# Altium schematic symbol library jlcpcb_2025_04_capacitors_extended_1206.schlib: 2503 symbols (part 10 of 14) (continued)
## GCM31CC72A225KE02L
designator C?  Capacitance: 2.2uF  (hidden comment: *)
Capacitor, Ceramic (MLCC), 2.2uF, ±10%, 100V, X7S, ±10%, SMD 1206; Manufacturer: Murata Electronics; Manufacturer Part Number: GCM31CC72A225KE02L; Package Size: 1206; JLCPCB Basic Part: No; JLCPCB Part Number: C363965; Supplier 1: LCSC; Category: Capacitors - MLCC; Supplier Part Number 1: C363965; Tolerance: ±10%; Voltage Rating: 100V; Temperature Coefficient: X7S; RoHS: Yes; ComponentLink1Description: Datasheet; ComponentLink1URL: https://wmsc.lcsc.com/wmsc/upload/file/pdf/v2/lcsc/2304140030_Murata-Electronics-GCM31CC72A225KE02L_C363965.pdf; ComponentLink2Description: JLCPCB Part URL; ComponentLink2URL: https://jlcpcb.com/partdetail/C363965; ComponentLink3Description: LCSC Part URL; ComponentLink3URL: https://lcsc.com/product-detail/Multilayer-Ceramic-Capacitors-MLCC---SMD-SMT_Murata-Electronics-Murata-Electronics-GCM31CC72A225KE02L_C363965.html
footprint CAP-1206 (1206 (3216M) Capacitor)
pins: 1, 2

## GCM31CL8EL225KE07L
designator C?  Capacitance: 2.2uF  (hidden comment: *)
Capacitor, Ceramic (MLCC), 2.2uF, ±10%, 100V, X8L, ±10%, SMD 1206; Manufacturer: Murata Electronics; Manufacturer Part Number: GCM31CL8EL225KE07L; Package Size: 1206; JLCPCB Basic Part: No; JLCPCB Part Number: C710710; Supplier 1: LCSC; Category: Capacitors - MLCC; Supplier Part Number 1: C710710; Tolerance: ±10%; Voltage Rating: 100V; Temperature Coefficient: X8L; RoHS: Yes; ComponentLink1Description: Datasheet; ComponentLink1URL: https://wmsc.lcsc.com/wmsc/upload/file/pdf/v2/lcsc/2308111811_Murata-Electronics-GCM31CL8EL225KE07L_C710710.pdf; ComponentLink2Description: JLCPCB Part URL; ComponentLink2URL: https://jlcpcb.com/partdetail/C710710; ComponentLink3Description: LCSC Part URL; ComponentLink3URL: https://lcsc.com/product-detail/Multilayer-Ceramic-Capacitors-MLCC---SMD-SMT_Murata-Electronics-Murata-Electronics-GCM31CL8EL225KE07L_C710710.html
footprint CAP-1206 (1206 (3216M) Capacitor)
pins: 1, 2

## GCM31CL81H105KA55L
designator C?  Capacitance: 1uF  (hidden comment: *)
Capacitor, Ceramic (MLCC), 1uF, ±10%, 50V, X8L, ±10%, SMD 1206; Manufacturer: Murata Electronics; Manufacturer Part Number: GCM31CL81H105KA55L; Package Size: 1206; JLCPCB Basic Part: No; JLCPCB Part Number: C126596; Supplier 1: LCSC; Category: Capacitors - MLCC; Supplier Part Number 1: C126596; Tolerance: ±10%; Voltage Rating: 50V; Temperature Coefficient: X8L; RoHS: Yes; ComponentLink1Description: Datasheet; ComponentLink1URL: https://wmsc.lcsc.com/wmsc/upload/file/pdf/v2/lcsc/1912111437_Murata-Electronics-GCM31CL81H105KA55L_C126596.pdf; ComponentLink2Description: JLCPCB Part URL; ComponentLink2URL: https://jlcpcb.com/partdetail/C126596; ComponentLink3Description: LCSC Part URL; ComponentLink3URL: https://lcsc.com/product-detail/Multilayer-Ceramic-Capacitors-MLCC---SMD-SMT_Murata-Electronics-Murata-Electronics-GCM31CL81H105KA55L_C126596.html
footprint CAP-1206 (1206 (3216M) Capacitor)
pins: 1, 2

## GCM31CL81H684KA37L
designator C?  Capacitance: 680nF  (hidden comment: *)
Capacitor, Ceramic (MLCC), 680nF, ±10%, 50V, X8L, ±10%, SMD 1206; Manufacturer: Murata Electronics; Manufacturer Part Number: GCM31CL81H684KA37L; Package Size: 1206; JLCPCB Basic Part: No; JLCPCB Part Number: C3887924; Supplier 1: LCSC; Category: Capacitors - MLCC; Supplier Part Number 1: C3887924; Tolerance: ±10%; Voltage Rating: 50V; Temperature Coefficient: X8L; RoHS: Yes; ComponentLink1Description: Datasheet; ComponentLink1URL: https://wmsc.lcsc.com/wmsc/upload/file/pdf/v2/lcsc/2308111433_Murata-Electronics-GCM31CL81H684KA37L_C3887924.pdf; ComponentLink2Description: JLCPCB Part URL; ComponentLink2URL: https://jlcpcb.com/partdetail/C3887924; ComponentLink3Description: LCSC Part URL; ComponentLink3URL: https://lcsc.com/product-detail/Multilayer-Ceramic-Capacitors-MLCC---SMD-SMT_Murata-Electronics-Murata-Electronics-GCM31CL81H684KA37L_C3887924.html
footprint CAP-1206 (1206 (3216M) Capacitor)
pins: 1, 2

## GCM31CM8EG106KE08L
designator C?  Capacitance: 10uF  (hidden comment: *)
Capacitor, Ceramic (MLCC), 10uF, ±10%, 35V, X8M, ±10%, SMD 1206; Manufacturer: Murata Electronics; Manufacturer Part Number: GCM31CM8EG106KE08L; Package Size: 1206; JLCPCB Basic Part: No; JLCPCB Part Number: C3878597; Supplier 1: LCSC; Category: Capacitors - MLCC; Supplier Part Number 1: C3878597; Tolerance: ±10%; Voltage Rating: 35V; Temperature Coefficient: X8M; RoHS: Yes; ComponentLink1Description: Datasheet; ComponentLink1URL: https://wmsc.lcsc.com/wmsc/upload/file/pdf/v2/lcsc/2308111433_Murata-Electronics-GCM31CM8EG106KE08L_C3878597.pdf; ComponentLink2Description: JLCPCB Part URL; ComponentLink2URL: https://jlcpcb.com/partdetail/C3878597; ComponentLink3Description: LCSC Part URL; ComponentLink3URL: https://lcsc.com/product-detail/Multilayer-Ceramic-Capacitors-MLCC---SMD-SMT_Murata-Electronics-Murata-Electronics-GCM31CM8EG106KE08L_C3878597.html
footprint CAP-1206 (1206 (3216M) Capacitor)
pins: 1, 2

## GCM31CR70J226KE23L
designator C?  Capacitance: 22uF  (hidden comment: *)
Capacitor, Ceramic (MLCC), 22uF, ±10%, 6.3V, X7R, ±10%, SMD 1206; Manufacturer: Murata Electronics; Manufacturer Part Number: GCM31CR70J226KE23L; Package Size: 1206; JLCPCB Basic Part: No; JLCPCB Part Number: C417135; Supplier 1: LCSC; Category: Capacitors - MLCC; Supplier Part Number 1: C417135; Tolerance: ±10%; Voltage Rating: 6.3V; Temperature Coefficient: X7R; RoHS: Yes; ComponentLink1Description: Datasheet; ComponentLink1URL: https://wmsc.lcsc.com/wmsc/upload/file/pdf/v2/lcsc/1912111437_Murata-Electronics-GCM31CR70J226KE23L_C417135.pdf; ComponentLink2Description: JLCPCB Part URL; ComponentLink2URL: https://jlcpcb.com/partdetail/C417135; ComponentLink3Description: LCSC Part URL; ComponentLink3URL: https://lcsc.com/product-detail/Multilayer-Ceramic-Capacitors-MLCC---SMD-SMT_Murata-Electronics-Murata-Electronics-GCM31CR70J226KE23L_C417135.html
footprint CAP-1206 (1206 (3216M) Capacitor)
pins: 1, 2

## GCM31CR70J226ME23L
designator C?  Capacitance: 22uF  (hidden comment: *)
Capacitor, Ceramic (MLCC), 22uF, ±20%, 6.3V, X7R, ±20%, SMD 1206; Manufacturer: Murata Electronics; Manufacturer Part Number: GCM31CR70J226ME23L; Package Size: 1206; JLCPCB Basic Part: No; JLCPCB Part Number: C126597; Supplier 1: LCSC; Category: Capacitors - MLCC; Supplier Part Number 1: C126597; Tolerance: ±20%; Voltage Rating: 6.3V; Temperature Coefficient: X7R; RoHS: Yes; ComponentLink1Description: Datasheet; ComponentLink1URL: https://wmsc.lcsc.com/wmsc/upload/file/pdf/v2/lcsc/1912111437_Murata-Electronics-GCM31CR70J226ME23L_C126597.pdf; ComponentLink2Description: JLCPCB Part URL; ComponentLink2URL: https://jlcpcb.com/partdetail/C126597; ComponentLink3Description: LCSC Part URL; ComponentLink3URL: https://lcsc.com/product-detail/Multilayer-Ceramic-Capacitors-MLCC---SMD-SMT_Murata-Electronics-Murata-Electronics-GCM31CR70J226ME23L_C126597.html
footprint CAP-1206 (1206 (3216M) Capacitor)
pins: 1, 2

## GCM31CR71A226KE02L
designator C?  Capacitance: 22uF  (hidden comment: *)
Capacitor, Ceramic (MLCC), 22uF, ±10%, 10V, X7R, ±10%, SMD 1206; Manufacturer: Murata Electronics; Manufacturer Part Number: GCM31CR71A226KE02L; Package Size: 1206; JLCPCB Basic Part: No; JLCPCB Part Number: C126598; Supplier 1: LCSC; Category: Capacitors - MLCC; Supplier Part Number 1: C126598; Tolerance: ±10%; Voltage Rating: 10V; Temperature Coefficient: X7R; RoHS: Yes; ComponentLink1Description: Datasheet; ComponentLink1URL: https://wmsc.lcsc.com/wmsc/upload/file/pdf/v2/lcsc/1810201313_Murata-Electronics-GCM31CR71A226KE02L_C126598.pdf; ComponentLink2Description: JLCPCB Part URL; ComponentLink2URL: https://jlcpcb.com/partdetail/C126598; ComponentLink3Description: LCSC Part URL; ComponentLink3URL: https://lcsc.com/product-detail/Multilayer-Ceramic-Capacitors-MLCC---SMD-SMT_Murata-Electronics-Murata-Electronics-GCM31CR71A226KE02L_C126598.html
footprint CAP-1206 (1206 (3216M) Capacitor)
pins: 1, 2

## GCM31CR71A226ME02L
designator C?  Capacitance: 22uF  (hidden comment: *)
Capacitor, Ceramic (MLCC), 22uF, ±20%, 10V, X7R, ±20%, SMD 1206; Manufacturer: Murata Electronics; Manufacturer Part Number: GCM31CR71A226ME02L; Package Size: 1206; JLCPCB Basic Part: No; JLCPCB Part Number: C710711; Supplier 1: LCSC; Category: Capacitors - MLCC; Supplier Part Number 1: C710711; Tolerance: ±20%; Voltage Rating: 10V; Temperature Coefficient: X7R; RoHS: Yes; ComponentLink1Description: Datasheet; ComponentLink1URL: https://wmsc.lcsc.com/wmsc/upload/file/pdf/v2/lcsc/2109162030_Murata-Electronics-GCM31CR71A226ME02L_C710711.pdf; ComponentLink2Description: JLCPCB Part URL; ComponentLink2URL: https://jlcpcb.com/partdetail/C710711; ComponentLink3Description: LCSC Part URL; ComponentLink3URL: https://lcsc.com/product-detail/Multilayer-Ceramic-Capacitors-MLCC---SMD-SMT_Murata-Electronics-Murata-Electronics-GCM31CR71A226ME02L_C710711.html
footprint CAP-1206 (1206 (3216M) Capacitor)
pins: 1, 2

## GCM31CR71C106KA64L
designator C?  Capacitance: 10uF  (hidden comment: *)
Capacitor, Ceramic (MLCC), 10uF, ±10%, 16V, X7R, ±10%, SMD 1206; Manufacturer: Murata Electronics; Manufacturer Part Number: GCM31CR71C106KA64L; Package Size: 1206; JLCPCB Basic Part: No; JLCPCB Part Number: C126600; Supplier 1: LCSC; Category: Capacitors - MLCC; Supplier Part Number 1: C126600; Tolerance: ±10%; Voltage Rating: 16V; Temperature Coefficient: X7R; RoHS: Yes; ComponentLink1Description: Datasheet; ComponentLink1URL: https://wmsc.lcsc.com/wmsc/upload/file/pdf/v2/lcsc/1809301611_Murata-Electronics-GCM31CR71C106KA64L_C126600.pdf; ComponentLink2Description: JLCPCB Part URL; ComponentLink2URL: https://jlcpcb.com/partdetail/C126600; ComponentLink3Description: LCSC Part URL; ComponentLink3URL: https://lcsc.com/product-detail/Multilayer-Ceramic-Capacitors-MLCC---SMD-SMT_Murata-Electronics-Murata-Electronics-GCM31CR71C106KA64L_C126600.html
footprint CAP-1206 (1206 (3216M) Capacitor)
pins: 1, 2

## GCM31CR71C475KA37L
designator C?  Capacitance: 4.7uF  (hidden comment: *)
Capacitor, Ceramic (MLCC), 4.7uF, ±10%, 16V, X7R, ±10%, SMD 1206; Manufacturer: Murata Electronics; Manufacturer Part Number: GCM31CR71C475KA37L; Package Size: 1206; JLCPCB Basic Part: No; JLCPCB Part Number: C126601; Supplier 1: LCSC; Category: Capacitors - MLCC; Supplier Part Number 1: C126601; Tolerance: ±10%; Voltage Rating: 16V; Temperature Coefficient: X7R; RoHS: Yes; ComponentLink1Description: Datasheet; ComponentLink1URL: https://wmsc.lcsc.com/wmsc/upload/file/pdf/v2/lcsc/1912111437_Murata-Electronics-GCM31CR71C475KA37L_C126601.pdf; ComponentLink2Description: JLCPCB Part URL; ComponentLink2URL: https://jlcpcb.com/partdetail/C126601; ComponentLink3Description: LCSC Part URL; ComponentLink3URL: https://lcsc.com/product-detail/Multilayer-Ceramic-Capacitors-MLCC---SMD-SMT_Murata-Electronics-Murata-Electronics-GCM31CR71C475KA37L_C126601.html
footprint CAP-1206 (1206 (3216M) Capacitor)
pins: 1, 2

## GCM31CR71E475KA55L
designator C?  Capacitance: 4.7uF  (hidden comment: *)
Capacitor, Ceramic (MLCC), 4.7uF, ±10%, 25V, X7R, ±10%, SMD 1206; Manufacturer: Murata Electronics; Manufacturer Part Number: GCM31CR71E475KA55L; Package Size: 1206; JLCPCB Basic Part: No; JLCPCB Part Number: C91602; Supplier 1: LCSC; Category: Capacitors - MLCC; Supplier Part Number 1: C91602; Tolerance: ±10%; Voltage Rating: 25V; Temperature Coefficient: X7R; RoHS: Yes; ComponentLink1Description: Datasheet; ComponentLink1URL: https://wmsc.lcsc.com/wmsc/upload/file/pdf/v2/lcsc/1810201312_Murata-Electronics-GCM31CR71E475KA55L_C91602.pdf; ComponentLink2Description: JLCPCB Part URL; ComponentLink2URL: https://jlcpcb.com/partdetail/C91602; ComponentLink3Description: LCSC Part URL; ComponentLink3URL: https://lcsc.com/product-detail/Multilayer-Ceramic-Capacitors-MLCC---SMD-SMT_Murata-Electronics-Murata-Electronics-GCM31CR71E475KA55L_C91602.html
footprint CAP-1206 (1206 (3216M) Capacitor)
pins: 1, 2

## GCM31CR71H225KA40L
designator C?  Capacitance: 2.2uF  (hidden comment: *)
Capacitor, Ceramic (MLCC), 2.2uF, ±10%, 50V, X7R, ±10%, SMD 1206; Manufacturer: Murata Electronics; Manufacturer Part Number: GCM31CR71H225KA40L; Package Size: 1206; JLCPCB Basic Part: No; JLCPCB Part Number: C521233; Supplier 1: LCSC; Category: Capacitors - MLCC; Supplier Part Number 1: C521233; Tolerance: ±10%; Voltage Rating: 50V; Temperature Coefficient: X7R; RoHS: Yes; ComponentLink1Description: Datasheet; ComponentLink1URL: https://wmsc.lcsc.com/wmsc/upload/file/pdf/v2/lcsc/2304140030_Murata-Electronics-GCM31CR71H225KA40L_C521233.pdf; ComponentLink2Description: JLCPCB Part URL; ComponentLink2URL: https://jlcpcb.com/partdetail/C521233; ComponentLink3Description: LCSC Part URL; ComponentLink3URL: https://lcsc.com/product-detail/Multilayer-Ceramic-Capacitors-MLCC---SMD-SMT_Murata-Electronics-Murata-Electronics-GCM31CR71H225KA40L_C521233.html
footprint CAP-1206 (1206 (3216M) Capacitor)
pins: 1, 2

## GCM31CR71H225KA55K
designator C?  Capacitance: 2.2uF  (hidden comment: *)
Capacitor, Ceramic (MLCC), 2.2uF, ±10%, 50V, X7R, ±10%, SMD 1206; Manufacturer: Murata Electronics; Manufacturer Part Number: GCM31CR71H225KA55K; Package Size: 1206; JLCPCB Basic Part: No; JLCPCB Part Number: C3898561; Supplier 1: LCSC; Category: Capacitors - MLCC; Supplier Part Number 1: C3898561; Tolerance: ±10%; Voltage Rating: 50V; Temperature Coefficient: X7R; RoHS: Yes; ComponentLink1Description: Datasheet; ComponentLink1URL: https://wmsc.lcsc.com/wmsc/upload/file/pdf/v2/lcsc/2308111433_Murata-Electronics-GCM31CR71H225KA55K_C3898561.pdf; ComponentLink2Description: JLCPCB Part URL; ComponentLink2URL: https://jlcpcb.com/partdetail/C3898561; ComponentLink3Description: LCSC Part URL; ComponentLink3URL: https://lcsc.com/product-detail/Multilayer-Ceramic-Capacitors-MLCC---SMD-SMT_Murata-Electronics-Murata-Electronics-GCM31CR71H225KA55K_C3898561.html
footprint CAP-1206 (1206 (3216M) Capacitor)
pins: 1, 2

## GCM31CR71H225KA55L
designator C?  Capacitance: 2.2uF  (hidden comment: *)
Capacitor, Ceramic (MLCC), 2.2uF, ±10%, 50V, X7R, ±10%, SMD 1206; Manufacturer: Murata Electronics; Manufacturer Part Number: GCM31CR71H225KA55L; Package Size: 1206; JLCPCB Basic Part: No; JLCPCB Part Number: C126604; Supplier 1: LCSC; Category: Capacitors - MLCC; Supplier Part Number 1: C126604; Tolerance: ±10%; Voltage Rating: 50V; Temperature Coefficient: X7R; RoHS: Yes; ComponentLink1Description: Datasheet; ComponentLink1URL: https://wmsc.lcsc.com/wmsc/upload/file/pdf/v2/lcsc/1810201230_Murata-Electronics-GCM31CR71H225KA55L_C126604.pdf; ComponentLink2Description: JLCPCB Part URL; ComponentLink2URL: https://jlcpcb.com/partdetail/C126604; ComponentLink3Description: LCSC Part URL; ComponentLink3URL: https://lcsc.com/product-detail/Multilayer-Ceramic-Capacitors-MLCC---SMD-SMT_Murata-Electronics-Murata-Electronics-GCM31CR71H225KA55L_C126604.html
footprint CAP-1206 (1206 (3216M) Capacitor)
pins: 1, 2

## GCM31CR71H684KA37L
designator C?  Capacitance: 680nF  (hidden comment: *)
Capacitor, Ceramic (MLCC), 680nF, ±10%, 50V, X7R, ±10%, SMD 1206; Manufacturer: Murata Electronics; Manufacturer Part Number: GCM31CR71H684KA37L; Package Size: 1206; JLCPCB Basic Part: No; JLCPCB Part Number: C435396; Supplier 1: LCSC; Category: Capacitors - MLCC; Supplier Part Number 1: C435396; Tolerance: ±10%; Voltage Rating: 50V; Temperature Coefficient: X7R; RoHS: Yes; ComponentLink1Description: Datasheet; ComponentLink1URL: https://wmsc.lcsc.com/wmsc/upload/file/pdf/v2/lcsc/2304140030_Murata-Electronics-GCM31CR71H684KA37L_C435396.pdf; ComponentLink2Description: JLCPCB Part URL; ComponentLink2URL: https://jlcpcb.com/partdetail/C435396; ComponentLink3Description: LCSC Part URL; ComponentLink3URL: https://lcsc.com/product-detail/Multilayer-Ceramic-Capacitors-MLCC---SMD-SMT_Murata-Electronics-Murata-Electronics-GCM31CR71H684KA37L_C435396.html
footprint CAP-1206 (1206 (3216M) Capacitor)
pins: 1, 2

## GCM31CR72A105KA03L
designator C?  Capacitance: 1uF  (hidden comment: *)
Capacitor, Ceramic (MLCC), 1uF, ±10%, 100V, X7R, ±10%, SMD 1206; Manufacturer: Murata Electronics; Manufacturer Part Number: GCM31CR72A105KA03L; Package Size: 1206; JLCPCB Basic Part: No; JLCPCB Part Number: C408556; Supplier 1: LCSC; Category: Capacitors - MLCC; Supplier Part Number 1: C408556; Tolerance: ±10%; Voltage Rating: 100V; Temperature Coefficient: X7R; RoHS: Yes; ComponentLink1Description: Datasheet; ComponentLink1URL: https://wmsc.lcsc.com/wmsc/upload/file/pdf/v2/lcsc/1912111437_Murata-Electronics-GCM31CR72A105KA03L_C408556.pdf; ComponentLink2Description: JLCPCB Part URL; ComponentLink2URL: https://jlcpcb.com/partdetail/C408556; ComponentLink3Description: LCSC Part URL; ComponentLink3URL: https://lcsc.com/product-detail/Multilayer-Ceramic-Capacitors-MLCC---SMD-SMT_Murata-Electronics-Murata-Electronics-GCM31CR72A105KA03L_C408556.html
footprint CAP-1206 (1206 (3216M) Capacitor)
pins: 1, 2

## GCM31M5C1H473JA16L
designator C?  Capacitance: 47nF  (hidden comment: *)
Capacitor, Ceramic (MLCC), 47nF, ±5%, null, ±5%, SMD 1206; Manufacturer: Murata Electronics; Manufacturer Part Number: GCM31M5C1H473JA16L; Package Size: 1206; JLCPCB Basic Part: No; JLCPCB Part Number: C913751; Supplier 1: LCSC; Category: Capacitors - MLCC; Supplier Part Number 1: C913751; Tolerance: ±5%; Voltage Rating: null; RoHS: Yes; ComponentLink1Description: Datasheet; ComponentLink1URL: https://wmsc.lcsc.com/wmsc/upload/file/pdf/v2/lcsc/2304140030_Murata-Electronics-GCM31M5C1H473JA16L_C913751.pdf; ComponentLink2Description: JLCPCB Part URL; ComponentLink2URL: https://jlcpcb.com/partdetail/C913751; ComponentLink3Description: LCSC Part URL; ComponentLink3URL: https://lcsc.com/product-detail/Multilayer-Ceramic-Capacitors-MLCC---SMD-SMT_Murata-Electronics-Murata-Electronics-GCM31M5C1H473JA16L_C913751.html
footprint CAP-1206 (1206 (3216M) Capacitor)
pins: 1, 2

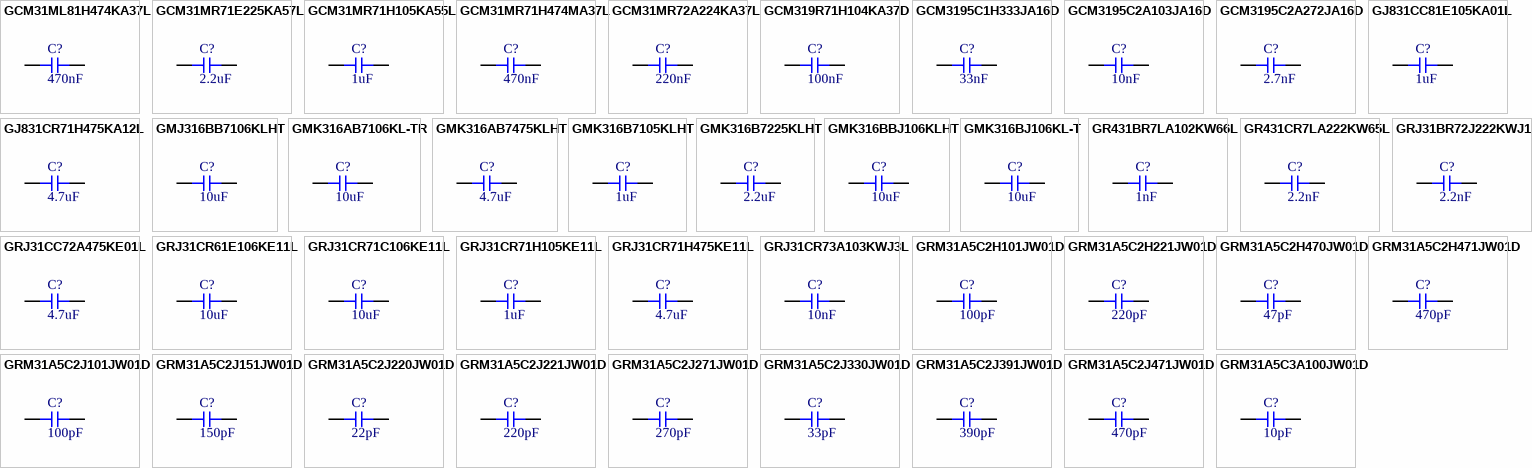
[diagram p45: symbols GCM31ML81H474KA37L to GRM31A5C3A100JW01D]

## GCM31ML81H474KA37L
designator C?  Capacitance: 470nF  (hidden comment: *)
Capacitor, Ceramic (MLCC), 470nF, ±10%, 50V, ±10%, SMD 1206; Manufacturer: Murata Electronics; Manufacturer Part Number: GCM31ML81H474KA37L; Package Size: 1206; JLCPCB Basic Part: No; JLCPCB Part Number: C2280144; Supplier 1: LCSC; Category: Capacitors - MLCC; Supplier Part Number 1: C2280144; Tolerance: ±10%; Voltage Rating: 50V; RoHS: Yes; ComponentLink1Description: Datasheet; ComponentLink1URL: https://wmsc.lcsc.com/wmsc/upload/file/pdf/v2/lcsc/2308111610_Murata-Electronics-GCM31ML81H474KA37L_C2280144.pdf; ComponentLink2Description: JLCPCB Part URL; ComponentLink2URL: https://jlcpcb.com/partdetail/C2280144; ComponentLink3Description: LCSC Part URL; ComponentLink3URL: https://lcsc.com/product-detail/Multilayer-Ceramic-Capacitors-MLCC---SMD-SMT_Murata-Electronics-Murata-Electronics-GCM31ML81H474KA37L_C2280144.html
footprint CAP-1206 (1206 (3216M) Capacitor)
pins: 1, 2

## GCM31MR71E225KA57L
designator C?  Capacitance: 2.2uF  (hidden comment: *)
Capacitor, Ceramic (MLCC), 2.2uF, ±10%, 25V, X7R, ±10%, SMD 1206; Manufacturer: Murata Electronics; Manufacturer Part Number: GCM31MR71E225KA57L; Package Size: 1206; JLCPCB Basic Part: No; JLCPCB Part Number: C126609; Supplier 1: LCSC; Category: Capacitors - MLCC; Supplier Part Number 1: C126609; Tolerance: ±10%; Voltage Rating: 25V; Temperature Coefficient: X7R; RoHS: Yes; ComponentLink1Description: Datasheet; ComponentLink1URL: https://wmsc.lcsc.com/wmsc/upload/file/pdf/v2/lcsc/1811141815_Murata-Electronics-GCM31MR71E225KA57L_C126609.pdf; ComponentLink2Description: JLCPCB Part URL; ComponentLink2URL: https://jlcpcb.com/partdetail/C126609; ComponentLink3Description: LCSC Part URL; ComponentLink3URL: https://lcsc.com/product-detail/Multilayer-Ceramic-Capacitors-MLCC---SMD-SMT_Murata-Electronics-Murata-Electronics-GCM31MR71E225KA57L_C126609.html
footprint CAP-1206 (1206 (3216M) Capacitor)
pins: 1, 2

## GCM31MR71H105KA55L
designator C?  Capacitance: 1uF  (hidden comment: *)
Capacitor, Ceramic (MLCC), 1uF, ±10%, 50V, X7R, ±10%, SMD 1206; Manufacturer: Murata Electronics; Manufacturer Part Number: GCM31MR71H105KA55L; Package Size: 1206; JLCPCB Basic Part: No; JLCPCB Part Number: C85867; Supplier 1: LCSC; Category: Capacitors - MLCC; Supplier Part Number 1: C85867; Tolerance: ±10%; Voltage Rating: 50V; Temperature Coefficient: X7R; RoHS: Yes; ComponentLink1Description: Datasheet; ComponentLink1URL: https://wmsc.lcsc.com/wmsc/upload/file/pdf/v2/lcsc/2304140030_Murata-Electronics-GCM31MR71H105KA55L_C85867.pdf; ComponentLink2Description: JLCPCB Part URL; ComponentLink2URL: https://jlcpcb.com/partdetail/C85867; ComponentLink3Description: LCSC Part URL; ComponentLink3URL: https://lcsc.com/product-detail/Multilayer-Ceramic-Capacitors-MLCC---SMD-SMT_Murata-Electronics-Murata-Electronics-GCM31MR71H105KA55L_C85867.html
footprint CAP-1206 (1206 (3216M) Capacitor)
pins: 1, 2

## GCM31MR71H474MA37L
designator C?  Capacitance: 470nF  (hidden comment: *)
Capacitor, Ceramic (MLCC), 470nF, ±20%, 50V, X7R, ±20%, SMD 1206; Manufacturer: Murata Electronics; Manufacturer Part Number: GCM31MR71H474MA37L; Package Size: 1206; JLCPCB Basic Part: No; JLCPCB Part Number: C161276; Supplier 1: LCSC; Category: Capacitors - MLCC; Supplier Part Number 1: C161276; Tolerance: ±20%; Voltage Rating: 50V; Temperature Coefficient: X7R; RoHS: Yes; ComponentLink1Description: Datasheet; ComponentLink1URL: https://wmsc.lcsc.com/wmsc/upload/file/pdf/v2/lcsc/1810201316_Murata-Electronics-GCM31MR71H474MA37L_C161276.pdf; ComponentLink2Description: JLCPCB Part URL; ComponentLink2URL: https://jlcpcb.com/partdetail/C161276; ComponentLink3Description: LCSC Part URL; ComponentLink3URL: https://lcsc.com/product-detail/Multilayer-Ceramic-Capacitors-MLCC---SMD-SMT_Murata-Electronics-Murata-Electronics-GCM31MR71H474MA37L_C161276.html
footprint CAP-1206 (1206 (3216M) Capacitor)
pins: 1, 2

## GCM31MR72A224KA37L
designator C?  Capacitance: 220nF  (hidden comment: *)
Capacitor, Ceramic (MLCC), 220nF, ±10%, 100V, X7R, ±10%, SMD 1206; Manufacturer: Murata Electronics; Manufacturer Part Number: GCM31MR72A224KA37L; Package Size: 1206; JLCPCB Basic Part: No; JLCPCB Part Number: C161277; Supplier 1: LCSC; Category: Capacitors - MLCC; Supplier Part Number 1: C161277; Tolerance: ±10%; Voltage Rating: 100V; Temperature Coefficient: X7R; RoHS: Yes; ComponentLink1Description: Datasheet; ComponentLink1URL: https://wmsc.lcsc.com/wmsc/upload/file/pdf/v2/lcsc/1810201316_Murata-Electronics-GCM31MR72A224KA37L_C161277.pdf; ComponentLink2Description: JLCPCB Part URL; ComponentLink2URL: https://jlcpcb.com/partdetail/C161277; ComponentLink3Description: LCSC Part URL; ComponentLink3URL: https://lcsc.com/product-detail/Multilayer-Ceramic-Capacitors-MLCC---SMD-SMT_Murata-Electronics-Murata-Electronics-GCM31MR72A224KA37L_C161277.html
footprint CAP-1206 (1206 (3216M) Capacitor)
pins: 1, 2

## GCM319R71H104KA37D
designator C?  Capacitance: 100nF  (hidden comment: *)
Capacitor, Ceramic (MLCC), 100nF, ±10%, 50V, X7R, ±10%, SMD 1206; Manufacturer: Murata Electronics; Manufacturer Part Number: GCM319R71H104KA37D; Package Size: 1206; JLCPCB Basic Part: No; JLCPCB Part Number: C161270; Supplier 1: LCSC; Category: Capacitors - MLCC; Supplier Part Number 1: C161270; Tolerance: ±10%; Voltage Rating: 50V; Temperature Coefficient: X7R; RoHS: Yes; ComponentLink1Description: Datasheet; ComponentLink1URL: https://wmsc.lcsc.com/wmsc/upload/file/pdf/v2/lcsc/2304140030_Murata-Electronics-GCM319R71H104KA37D_C161270.pdf; ComponentLink2Description: JLCPCB Part URL; ComponentLink2URL: https://jlcpcb.com/partdetail/C161270; ComponentLink3Description: LCSC Part URL; ComponentLink3URL: https://lcsc.com/product-detail/Multilayer-Ceramic-Capacitors-MLCC---SMD-SMT_Murata-Electronics-Murata-Electronics-GCM319R71H104KA37D_C161270.html
footprint CAP-1206 (1206 (3216M) Capacitor)
pins: 1, 2

## GCM3195C1H333JA16D
designator C?  Capacitance: 33nF  (hidden comment: *)
Capacitor, Ceramic (MLCC), 33nF, ±5%, 50V, C0G, ±5%, SMD 1206; Manufacturer: Murata Electronics; Manufacturer Part Number: GCM3195C1H333JA16D; Package Size: 1206; JLCPCB Basic Part: No; JLCPCB Part Number: C435395; Supplier 1: LCSC; Category: Capacitors - MLCC; Supplier Part Number 1: C435395; Tolerance: ±5%; Voltage Rating: 50V; Temperature Coefficient: C0G; RoHS: Yes; ComponentLink1Description: Datasheet; ComponentLink1URL: https://wmsc.lcsc.com/wmsc/upload/file/pdf/v2/lcsc/2304140030_Murata-Electronics-GCM3195C1H333JA16D_C435395.pdf; ComponentLink2Description: JLCPCB Part URL; ComponentLink2URL: https://jlcpcb.com/partdetail/C435395; ComponentLink3Description: LCSC Part URL; ComponentLink3URL: https://lcsc.com/product-detail/Multilayer-Ceramic-Capacitors-MLCC---SMD-SMT_Murata-Electronics-Murata-Electronics-GCM3195C1H333JA16D_C435395.html
footprint CAP-1206 (1206 (3216M) Capacitor)
pins: 1, 2

## GCM3195C2A103JA16D
designator C?  Capacitance: 10nF  (hidden comment: *)
Capacitor, Ceramic (MLCC), 10nF, ±5%, 100V, C0G, ±5%, SMD 1206; Manufacturer: Murata Electronics; Manufacturer Part Number: GCM3195C2A103JA16D; Package Size: 1206; JLCPCB Basic Part: No; JLCPCB Part Number: C184799; Supplier 1: LCSC; Category: Capacitors - MLCC; Supplier Part Number 1: C184799; Tolerance: ±5%; Voltage Rating: 100V; Temperature Coefficient: C0G; RoHS: Yes; ComponentLink1Description: Datasheet; ComponentLink1URL: https://wmsc.lcsc.com/wmsc/upload/file/pdf/v2/lcsc/2304140030_Murata-Electronics-GCM3195C2A103JA16D_C184799.pdf; ComponentLink2Description: JLCPCB Part URL; ComponentLink2URL: https://jlcpcb.com/partdetail/C184799; ComponentLink3Description: LCSC Part URL; ComponentLink3URL: https://lcsc.com/product-detail/Multilayer-Ceramic-Capacitors-MLCC---SMD-SMT_Murata-Electronics-Murata-Electronics-GCM3195C2A103JA16D_C184799.html
footprint CAP-1206 (1206 (3216M) Capacitor)
pins: 1, 2

## GCM3195C2A272JA16D
designator C?  Capacitance: 2.7nF  (hidden comment: *)
Capacitor, Ceramic (MLCC), 2.7nF, ±5%, 100V, C0G, ±5%, SMD 1206; Manufacturer: Murata Electronics; Manufacturer Part Number: GCM3195C2A272JA16D; Package Size: 1206; JLCPCB Basic Part: No; JLCPCB Part Number: C437495; Supplier 1: LCSC; Category: Capacitors - MLCC; Supplier Part Number 1: C437495; Tolerance: ±5%; Voltage Rating: 100V; Temperature Coefficient: C0G; RoHS: Yes; ComponentLink1Description: Datasheet; ComponentLink1URL: https://wmsc.lcsc.com/wmsc/upload/file/pdf/v2/lcsc/2304140030_Murata-Electronics-GCM3195C2A272JA16D_C437495.pdf; ComponentLink2Description: JLCPCB Part URL; ComponentLink2URL: https://jlcpcb.com/partdetail/C437495; ComponentLink3Description: LCSC Part URL; ComponentLink3URL: https://lcsc.com/product-detail/Multilayer-Ceramic-Capacitors-MLCC---SMD-SMT_Murata-Electronics-Murata-Electronics-GCM3195C2A272JA16D_C437495.html
footprint CAP-1206 (1206 (3216M) Capacitor)
pins: 1, 2

## GJ831CC81E105KA01L
designator C?  Capacitance: 1uF  (hidden comment: *)
Capacitor, Ceramic (MLCC), 1uF, ±10%, 25V, X6S, ±10%, SMD 1206; Manufacturer: Murata Electronics; Manufacturer Part Number: GJ831CC81E105KA01L; Package Size: 1206; JLCPCB Basic Part: No; JLCPCB Part Number: C397311; Supplier 1: LCSC; Category: Capacitors - MLCC; Supplier Part Number 1: C397311; Tolerance: ±10%; Voltage Rating: 25V; Temperature Coefficient: X6S; RoHS: Yes; ComponentLink1Description: Datasheet; ComponentLink1URL: https://wmsc.lcsc.com/wmsc/upload/file/pdf/v2/lcsc/1912111437_Murata-Electronics-GJ831CC81E105KA01L_C397311.pdf; ComponentLink2Description: JLCPCB Part URL; ComponentLink2URL: https://jlcpcb.com/partdetail/C397311; ComponentLink3Description: LCSC Part URL; ComponentLink3URL: https://lcsc.com/product-detail/Multilayer-Ceramic-Capacitors-MLCC---SMD-SMT_Murata-Electronics-Murata-Electronics-GJ831CC81E105KA01L_C397311.html
footprint CAP-1206 (1206 (3216M) Capacitor)
pins: 1, 2

## GJ831CR71H475KA12L
designator C?  Capacitance: 4.7uF  (hidden comment: *)
Capacitor, Ceramic (MLCC), 4.7uF, ±10%, 50V, X7R, ±10%, SMD 1206; Manufacturer: Murata Electronics; Manufacturer Part Number: GJ831CR71H475KA12L; Package Size: 1206; JLCPCB Basic Part: No; JLCPCB Part Number: C469526; Supplier 1: LCSC; Category: Capacitors - MLCC; Supplier Part Number 1: C469526; Tolerance: ±10%; Voltage Rating: 50V; Temperature Coefficient: X7R; RoHS: Yes; ComponentLink1Description: Datasheet; ComponentLink1URL: https://wmsc.lcsc.com/wmsc/upload/file/pdf/v2/lcsc/2005281231_Murata-Electronics-GJ831CR71H475KA12L_C469526.pdf; ComponentLink2Description: JLCPCB Part URL; ComponentLink2URL: https://jlcpcb.com/partdetail/C469526; ComponentLink3Description: LCSC Part URL; ComponentLink3URL: https://lcsc.com/product-detail/Multilayer-Ceramic-Capacitors-MLCC---SMD-SMT_Murata-Electronics-Murata-Electronics-GJ831CR71H475KA12L_C469526.html
footprint CAP-1206 (1206 (3216M) Capacitor)
pins: 1, 2

## GMJ316BB7106KLHT
designator C?  Capacitance: 10uF  (hidden comment: *)
Capacitor, Ceramic (MLCC), 10uF, ±10%, 35V, X7R, ±10%, SMD 1206; Manufacturer: Taiyo Yuden; Manufacturer Part Number: GMJ316BB7106KLHT; Package Size: 1206; JLCPCB Basic Part: No; JLCPCB Part Number: C412612; Supplier 1: LCSC; Category: Capacitors - MLCC; Supplier Part Number 1: C412612; Tolerance: ±10%; Voltage Rating: 35V; Temperature Coefficient: X7R; RoHS: Yes; ComponentLink1Description: Datasheet; ComponentLink1URL: https://wmsc.lcsc.com/wmsc/upload/file/pdf/v2/lcsc/2304140030_Taiyo-Yuden-GMJ316BB7106KLHT_C412612.pdf; ComponentLink2Description: JLCPCB Part URL; ComponentLink2URL: https://jlcpcb.com/partdetail/C412612; ComponentLink3Description: LCSC Part URL; ComponentLink3URL: https://lcsc.com/product-detail/Multilayer-Ceramic-Capacitors-MLCC---SMD-SMT_Taiyo-Yuden-Taiyo-Yuden-GMJ316BB7106KLHT_C412612.html
footprint CAP-1206 (1206 (3216M) Capacitor)
pins: 1, 2

## GMK316AB7106KL-TR
designator C?  Capacitance: 10uF  (hidden comment: *)
Capacitor, Ceramic (MLCC), 10uF, ±10%, 35V, X7R, ±10%, SMD 1206; Manufacturer: Taiyo Yuden; Manufacturer Part Number: GMK316AB7106KL-TR; Package Size: 1206; JLCPCB Basic Part: No; JLCPCB Part Number: C454102; Supplier 1: LCSC; Category: Capacitors - MLCC; Supplier Part Number 1: C454102; Tolerance: ±10%; Voltage Rating: 35V; Temperature Coefficient: X7R; RoHS: Yes; ComponentLink1Description: Datasheet; ComponentLink1URL: https://wmsc.lcsc.com/wmsc/upload/file/pdf/v2/lcsc/2402230923_Taiyo-Yuden-GMK316AB7106KL-TR_C454102.pdf; ComponentLink2Description: JLCPCB Part URL; ComponentLink2URL: https://jlcpcb.com/partdetail/C454102; ComponentLink3Description: LCSC Part URL; ComponentLink3URL: https://lcsc.com/product-detail/Multilayer-Ceramic-Capacitors-MLCC---SMD-SMT_Taiyo-Yuden-Taiyo-Yuden-GMK316AB7106KL-TR_C454102.html
footprint CAP-1206 (1206 (3216M) Capacitor)
pins: 1, 2

## GMK316AB7475KLHT
designator C?  Capacitance: 4.7uF  (hidden comment: *)
Capacitor, Ceramic (MLCC), 4.7uF, ±10%, 35V, X7R, ±10%, SMD 1206; Manufacturer: Taiyo Yuden; Manufacturer Part Number: GMK316AB7475KLHT; Package Size: 1206; JLCPCB Basic Part: No; JLCPCB Part Number: C385966; Supplier 1: LCSC; Category: Capacitors - MLCC; Supplier Part Number 1: C385966; Tolerance: ±10%; Voltage Rating: 35V; Temperature Coefficient: X7R; RoHS: Yes; ComponentLink1Description: Datasheet; ComponentLink1URL: https://wmsc.lcsc.com/wmsc/upload/file/pdf/v2/lcsc/2404230933_Taiyo-Yuden-GMK316AB7475KLHT_C385966.pdf; ComponentLink2Description: JLCPCB Part URL; ComponentLink2URL: https://jlcpcb.com/partdetail/C385966; ComponentLink3Description: LCSC Part URL; ComponentLink3URL: https://lcsc.com/product-detail/Multilayer-Ceramic-Capacitors-MLCC---SMD-SMT_Taiyo-Yuden-Taiyo-Yuden-GMK316AB7475KLHT_C385966.html
footprint CAP-1206 (1206 (3216M) Capacitor)
pins: 1, 2

## GMK316B7105KLHT
designator C?  Capacitance: 1uF  (hidden comment: *)
Capacitor, Ceramic (MLCC), 1uF, ±10%, 35V, X7R, ±10%, SMD 1206; Manufacturer: Taiyo Yuden; Manufacturer Part Number: GMK316B7105KLHT; Package Size: 1206; JLCPCB Basic Part: No; JLCPCB Part Number: C454103; Supplier 1: LCSC; Category: Capacitors - MLCC; Supplier Part Number 1: C454103; Tolerance: ±10%; Voltage Rating: 35V; Temperature Coefficient: X7R; RoHS: Yes; ComponentLink1Description: Datasheet; ComponentLink1URL: https://wmsc.lcsc.com/wmsc/upload/file/pdf/v2/lcsc/2304140030_Taiyo-Yuden-GMK316B7105KLHT_C454103.pdf; ComponentLink2Description: JLCPCB Part URL; ComponentLink2URL: https://jlcpcb.com/partdetail/C454103; ComponentLink3Description: LCSC Part URL; ComponentLink3URL: https://lcsc.com/product-detail/Multilayer-Ceramic-Capacitors-MLCC---SMD-SMT_Taiyo-Yuden-Taiyo-Yuden-GMK316B7105KLHT_C454103.html
footprint CAP-1206 (1206 (3216M) Capacitor)
pins: 1, 2

## GMK316B7225KLHT
designator C?  Capacitance: 2.2uF  (hidden comment: *)
Capacitor, Ceramic (MLCC), 2.2uF, ±10%, 35V, X7R, ±10%, SMD 1206; Manufacturer: Taiyo Yuden; Manufacturer Part Number: GMK316B7225KLHT; Package Size: 1206; JLCPCB Basic Part: No; JLCPCB Part Number: C655209; Supplier 1: LCSC; Category: Capacitors - MLCC; Supplier Part Number 1: C655209; Tolerance: ±10%; Voltage Rating: 35V; Temperature Coefficient: X7R; RoHS: Yes; ComponentLink1Description: Datasheet; ComponentLink1URL: https://wmsc.lcsc.com/wmsc/upload/file/pdf/v2/lcsc/2304140030_Taiyo-Yuden-GMK316B7225KLHT_C655209.pdf; ComponentLink2Description: JLCPCB Part URL; ComponentLink2URL: https://jlcpcb.com/partdetail/C655209; ComponentLink3Description: LCSC Part URL; ComponentLink3URL: https://lcsc.com/product-detail/Multilayer-Ceramic-Capacitors-MLCC---SMD-SMT_Taiyo-Yuden-Taiyo-Yuden-GMK316B7225KLHT_C655209.html
footprint CAP-1206 (1206 (3216M) Capacitor)
pins: 1, 2

## GMK316BBJ106KLHT
designator C?  Capacitance: 10uF  (hidden comment: *)
Capacitor, Ceramic (MLCC), 10uF, ±10%, 35V, X5R, ±10%, SMD 1206; Manufacturer: Taiyo Yuden; Manufacturer Part Number: GMK316BBJ106KLHT; Package Size: 1206; JLCPCB Basic Part: No; JLCPCB Part Number: C650968; Supplier 1: LCSC; Category: Capacitors - MLCC; Supplier Part Number 1: C650968; Tolerance: ±10%; Voltage Rating: 35V; Temperature Coefficient: X5R; RoHS: Yes; ComponentLink1Description: Datasheet; ComponentLink1URL: https://wmsc.lcsc.com/wmsc/upload/file/pdf/v2/lcsc/2304140030_Taiyo-Yuden-GMK316BBJ106KLHT_C650968.pdf; ComponentLink2Description: JLCPCB Part URL; ComponentLink2URL: https://jlcpcb.com/partdetail/C650968; ComponentLink3Description: LCSC Part URL; ComponentLink3URL: https://lcsc.com/product-detail/Multilayer-Ceramic-Capacitors-MLCC---SMD-SMT_Taiyo-Yuden-Taiyo-Yuden-GMK316BBJ106KLHT_C650968.html
footprint CAP-1206 (1206 (3216M) Capacitor)
pins: 1, 2

## GMK316BJ106KL-T
designator C?  Capacitance: 10uF  (hidden comment: *)
Capacitor, Ceramic (MLCC), 10uF, ±10%, 35V, X5R, ±10%, SMD 1206; Manufacturer: Taiyo Yuden; Manufacturer Part Number: GMK316BJ106KL-T; Package Size: 1206; JLCPCB Basic Part: No; JLCPCB Part Number: C92797; Supplier 1: LCSC; Category: Capacitors - MLCC; Supplier Part Number 1: C92797; Tolerance: ±10%; Voltage Rating: 35V; Temperature Coefficient: X5R; RoHS: Yes; ComponentLink1Description: Datasheet; ComponentLink1URL: https://wmsc.lcsc.com/wmsc/upload/file/pdf/v2/lcsc/2304140030_Taiyo-Yuden-GMK316BJ106KL-T_C92797.pdf; ComponentLink2Description: JLCPCB Part URL; ComponentLink2URL: https://jlcpcb.com/partdetail/C92797; ComponentLink3Description: LCSC Part URL; ComponentLink3URL: https://lcsc.com/product-detail/Multilayer-Ceramic-Capacitors-MLCC---SMD-SMT_Taiyo-Yuden-Taiyo-Yuden-GMK316BJ106KL-T_C92797.html
footprint CAP-1206 (1206 (3216M) Capacitor)
pins: 1, 2

## GR431BR7LA102KW66L
designator C?  Capacitance: 1nF  (hidden comment: *)
Capacitor, Ceramic (MLCC), 1nF, ±10%, 2kV, X7R, ±10%, SMD 1206; Manufacturer: Murata Electronics; Manufacturer Part Number: GR431BR7LA102KW66L; Package Size: 1206; JLCPCB Basic Part: No; JLCPCB Part Number: C161353; Supplier 1: LCSC; Category: Capacitors - MLCC; Supplier Part Number 1: C161353; Tolerance: ±10%; Voltage Rating: 2kV; Temperature Coefficient: X7R; RoHS: Yes; ComponentLink1Description: Datasheet; ComponentLink1URL: https://wmsc.lcsc.com/wmsc/upload/file/pdf/v2/lcsc/1804251044_Murata-Electronics-GR431BR7LA102KW66L_C161353.pdf; ComponentLink2Description: JLCPCB Part URL; ComponentLink2URL: https://jlcpcb.com/partdetail/C161353; ComponentLink3Description: LCSC Part URL; ComponentLink3URL: https://lcsc.com/product-detail/Multilayer-Ceramic-Capacitors-MLCC---SMD-SMT_Murata-Electronics-Murata-Electronics-GR431BR7LA102KW66L_C161353.html
footprint CAP-1206 (1206 (3216M) Capacitor)
pins: 1, 2

## GR431CR7LA222KW65L
designator C?  Capacitance: 2.2nF  (hidden comment: *)
Capacitor, Ceramic (MLCC), 2.2nF, ±10%, 2kV, X7R, ±10%, SMD 1206; Manufacturer: Murata Electronics; Manufacturer Part Number: GR431CR7LA222KW65L; Package Size: 1206; JLCPCB Basic Part: No; JLCPCB Part Number: C161354; Supplier 1: LCSC; Category: Capacitors - MLCC; Supplier Part Number 1: C161354; Tolerance: ±10%; Voltage Rating: 2kV; Temperature Coefficient: X7R; RoHS: Yes; ComponentLink1Description: Datasheet; ComponentLink2Description: JLCPCB Part URL; ComponentLink2URL: https://jlcpcb.com/partdetail/C161354; ComponentLink3Description: LCSC Part URL; ComponentLink3URL: https://lcsc.com/product-detail/Multilayer-Ceramic-Capacitors-MLCC---SMD-SMT_Murata-Electronics-Murata-Electronics-GR431CR7LA222KW65L_C161354.html
footprint CAP-1206 (1206 (3216M) Capacitor)
pins: 1, 2

## GRJ31BR72J222KWJ1L
designator C?  Capacitance: 2.2nF  (hidden comment: *)
Capacitor, Ceramic (MLCC), 2.2nF, ±10%, 630V, X7R, ±10%, SMD 1206; Manufacturer: Murata Electronics; Manufacturer Part Number: GRJ31BR72J222KWJ1L; Package Size: 1206; JLCPCB Basic Part: No; JLCPCB Part Number: C161359; Supplier 1: LCSC; Category: Capacitors - MLCC; Supplier Part Number 1: C161359; Tolerance: ±10%; Voltage Rating: 630V; Temperature Coefficient: X7R; RoHS: Yes; ComponentLink1Description: Datasheet; ComponentLink1URL: https://wmsc.lcsc.com/wmsc/upload/file/pdf/v2/lcsc/1810201243_Murata-Electronics-GRJ31BR72J222KWJ1L_C161359.pdf; ComponentLink2Description: JLCPCB Part URL; ComponentLink2URL: https://jlcpcb.com/partdetail/C161359; ComponentLink3Description: LCSC Part URL; ComponentLink3URL: https://lcsc.com/product-detail/Multilayer-Ceramic-Capacitors-MLCC---SMD-SMT_Murata-Electronics-Murata-Electronics-GRJ31BR72J222KWJ1L_C161359.html
footprint CAP-1206 (1206 (3216M) Capacitor)
pins: 1, 2

## GRJ31CC72A475KE01L
designator C?  Capacitance: 4.7uF  (hidden comment: *)
Capacitor, Ceramic (MLCC), 4.7uF, ±10%, 100V, X7S, ±10%, SMD 1206; Manufacturer: Murata Electronics; Manufacturer Part Number: GRJ31CC72A475KE01L; Package Size: 1206; JLCPCB Basic Part: No; JLCPCB Part Number: C3881858; Supplier 1: LCSC; Category: Capacitors - MLCC; Supplier Part Number 1: C3881858; Tolerance: ±10%; Voltage Rating: 100V; Temperature Coefficient: X7S; RoHS: Yes; ComponentLink1Description: Datasheet; ComponentLink1URL: https://wmsc.lcsc.com/wmsc/upload/file/pdf/v2/lcsc/2401222245_Murata-Electronics-GRJ31CC72A475KE01L_C3881858.pdf; ComponentLink2Description: JLCPCB Part URL; ComponentLink2URL: https://jlcpcb.com/partdetail/C3881858; ComponentLink3Description: LCSC Part URL; ComponentLink3URL: https://lcsc.com/product-detail/Multilayer-Ceramic-Capacitors-MLCC---SMD-SMT_Murata-Electronics-Murata-Electronics-GRJ31CC72A475KE01L_C3881858.html
footprint CAP-1206 (1206 (3216M) Capacitor)
pins: 1, 2

## GRJ31CR61E106KE11L
designator C?  Capacitance: 10uF  (hidden comment: *)
Capacitor, Ceramic (MLCC), 10uF, ±10%, 25V, X5R, ±10%, SMD 1206; Manufacturer: Murata Electronics; Manufacturer Part Number: GRJ31CR61E106KE11L; Package Size: 1206; JLCPCB Basic Part: No; JLCPCB Part Number: C435398; Supplier 1: LCSC; Category: Capacitors - MLCC; Supplier Part Number 1: C435398; Tolerance: ±10%; Voltage Rating: 25V; Temperature Coefficient: X5R; RoHS: Yes; ComponentLink1Description: Datasheet; ComponentLink1URL: https://wmsc.lcsc.com/wmsc/upload/file/pdf/v2/lcsc/2304140030_Murata-Electronics-GRJ31CR61E106KE11L_C435398.pdf; ComponentLink2Description: JLCPCB Part URL; ComponentLink2URL: https://jlcpcb.com/partdetail/C435398; ComponentLink3Description: LCSC Part URL; ComponentLink3URL: https://lcsc.com/product-detail/Multilayer-Ceramic-Capacitors-MLCC---SMD-SMT_Murata-Electronics-Murata-Electronics-GRJ31CR61E106KE11L_C435398.html
footprint CAP-1206 (1206 (3216M) Capacitor)
pins: 1, 2

## GRJ31CR71C106KE11L
designator C?  Capacitance: 10uF  (hidden comment: *)
Capacitor, Ceramic (MLCC), 10uF, ±10%, 16V, X7R, ±10%, SMD 1206; Manufacturer: Murata Electronics; Manufacturer Part Number: GRJ31CR71C106KE11L; Package Size: 1206; JLCPCB Basic Part: No; JLCPCB Part Number: C161360; Supplier 1: LCSC; Category: Capacitors - MLCC; Supplier Part Number 1: C161360; Tolerance: ±10%; Voltage Rating: 16V; Temperature Coefficient: X7R; RoHS: Yes; ComponentLink1Description: Datasheet; ComponentLink1URL: https://wmsc.lcsc.com/wmsc/upload/file/pdf/v2/lcsc/1810201241_Murata-Electronics-GRJ31CR71C106KE11L_C161360.pdf; ComponentLink2Description: JLCPCB Part URL; ComponentLink2URL: https://jlcpcb.com/partdetail/C161360; ComponentLink3Description: LCSC Part URL; ComponentLink3URL: https://lcsc.com/product-detail/Multilayer-Ceramic-Capacitors-MLCC---SMD-SMT_Murata-Electronics-Murata-Electronics-GRJ31CR71C106KE11L_C161360.html
footprint CAP-1206 (1206 (3216M) Capacitor)
pins: 1, 2

## GRJ31CR71H105KE11L
designator C?  Capacitance: 1uF  (hidden comment: *)
Capacitor, Ceramic (MLCC), 1uF, ±10%, 50V, X7R, ±10%, SMD 1206; Manufacturer: Murata Electronics; Manufacturer Part Number: GRJ31CR71H105KE11L; Package Size: 1206; JLCPCB Basic Part: No; JLCPCB Part Number: C521241; Supplier 1: LCSC; Category: Capacitors - MLCC; Supplier Part Number 1: C521241; Tolerance: ±10%; Voltage Rating: 50V; Temperature Coefficient: X7R; RoHS: Yes; ComponentLink1Description: Datasheet; ComponentLink1URL: https://wmsc.lcsc.com/wmsc/upload/file/pdf/v2/lcsc/2304140030_Murata-Electronics-GRJ31CR71H105KE11L_C521241.pdf; ComponentLink2Description: JLCPCB Part URL; ComponentLink2URL: https://jlcpcb.com/partdetail/C521241; ComponentLink3Description: LCSC Part URL; ComponentLink3URL: https://lcsc.com/product-detail/Multilayer-Ceramic-Capacitors-MLCC---SMD-SMT_Murata-Electronics-Murata-Electronics-GRJ31CR71H105KE11L_C521241.html
footprint CAP-1206 (1206 (3216M) Capacitor)
pins: 1, 2

## GRJ31CR71H475KE11L
designator C?  Capacitance: 4.7uF  (hidden comment: *)
Capacitor, Ceramic (MLCC), 4.7uF, ±10%, 50V, X7R, ±10%, SMD 1206; Manufacturer: Murata Electronics; Manufacturer Part Number: GRJ31CR71H475KE11L; Package Size: 1206; JLCPCB Basic Part: No; JLCPCB Part Number: C440156; Supplier 1: LCSC; Category: Capacitors - MLCC; Supplier Part Number 1: C440156; Tolerance: ±10%; Voltage Rating: 50V; Temperature Coefficient: X7R; RoHS: Yes; ComponentLink1Description: Datasheet; ComponentLink1URL: https://wmsc.lcsc.com/wmsc/upload/file/pdf/v2/lcsc/2304140030_Murata-Electronics-GRJ31CR71H475KE11L_C440156.pdf; ComponentLink2Description: JLCPCB Part URL; ComponentLink2URL: https://jlcpcb.com/partdetail/C440156; ComponentLink3Description: LCSC Part URL; ComponentLink3URL: https://lcsc.com/product-detail/Multilayer-Ceramic-Capacitors-MLCC---SMD-SMT_Murata-Electronics-Murata-Electronics-GRJ31CR71H475KE11L_C440156.html
footprint CAP-1206 (1206 (3216M) Capacitor)
pins: 1, 2

## GRJ31CR73A103KWJ3L
designator C?  Capacitance: 10nF  (hidden comment: *)
Capacitor, Ceramic (MLCC), 10nF, ±10%, 1kV, X7R, ±10%, SMD 1206; Manufacturer: Murata Electronics; Manufacturer Part Number: GRJ31CR73A103KWJ3L; Package Size: 1206; JLCPCB Basic Part: No; JLCPCB Part Number: C524561; Supplier 1: LCSC; Category: Capacitors - MLCC; Supplier Part Number 1: C524561; Tolerance: ±10%; Voltage Rating: 1kV; Temperature Coefficient: X7R; RoHS: Yes; ComponentLink1Description: Datasheet; ComponentLink1URL: https://wmsc.lcsc.com/wmsc/upload/file/pdf/v2/lcsc/2007231106_Murata-Electronics-GRJ31CR73A103KWJ3L_C524561.pdf; ComponentLink2Description: JLCPCB Part URL; ComponentLink2URL: https://jlcpcb.com/partdetail/C524561; ComponentLink3Description: LCSC Part URL; ComponentLink3URL: https://lcsc.com/product-detail/Multilayer-Ceramic-Capacitors-MLCC---SMD-SMT_Murata-Electronics-Murata-Electronics-GRJ31CR73A103KWJ3L_C524561.html
footprint CAP-1206 (1206 (3216M) Capacitor)
pins: 1, 2

## GRM31A5C2H101JW01D
designator C?  Capacitance: 100pF  (hidden comment: *)
Capacitor, Ceramic (MLCC), 100pF, ±5%, 500V, C0G, ±5%, SMD 1206; Manufacturer: Murata Electronics; Manufacturer Part Number: GRM31A5C2H101JW01D; Package Size: 1206; JLCPCB Basic Part: No; JLCPCB Part Number: C440202; Supplier 1: LCSC; Category: Capacitors - MLCC; Supplier Part Number 1: C440202; Tolerance: ±5%; Voltage Rating: 500V; Temperature Coefficient: C0G; RoHS: Yes; ComponentLink1Description: Datasheet; ComponentLink1URL: https://wmsc.lcsc.com/wmsc/upload/file/pdf/v2/lcsc/2304140030_Murata-Electronics-GRM31A5C2H101JW01D_C440202.pdf; ComponentLink2Description: JLCPCB Part URL; ComponentLink2URL: https://jlcpcb.com/partdetail/C440202; ComponentLink3Description: LCSC Part URL; ComponentLink3URL: https://lcsc.com/product-detail/Multilayer-Ceramic-Capacitors-MLCC---SMD-SMT_Murata-Electronics-Murata-Electronics-GRM31A5C2H101JW01D_C440202.html
footprint CAP-1206 (1206 (3216M) Capacitor)
pins: 1, 2

## GRM31A5C2H221JW01D
designator C?  Capacitance: 220pF  (hidden comment: *)
Capacitor, Ceramic (MLCC), 220pF, ±5%, 500V, C0G, ±5%, SMD 1206; Manufacturer: Murata Electronics; Manufacturer Part Number: GRM31A5C2H221JW01D; Package Size: 1206; JLCPCB Basic Part: No; JLCPCB Part Number: C711017; Supplier 1: LCSC; Category: Capacitors - MLCC; Supplier Part Number 1: C711017; Tolerance: ±5%; Voltage Rating: 500V; Temperature Coefficient: C0G; RoHS: Yes; ComponentLink1Description: Datasheet; ComponentLink1URL: https://wmsc.lcsc.com/wmsc/upload/file/pdf/v2/lcsc/2308111813_Murata-Electronics-GRM31A5C2H221JW01D_C711017.pdf; ComponentLink2Description: JLCPCB Part URL; ComponentLink2URL: https://jlcpcb.com/partdetail/C711017; ComponentLink3Description: LCSC Part URL; ComponentLink3URL: https://lcsc.com/product-detail/Multilayer-Ceramic-Capacitors-MLCC---SMD-SMT_Murata-Electronics-Murata-Electronics-GRM31A5C2H221JW01D_C711017.html
footprint CAP-1206 (1206 (3216M) Capacitor)
pins: 1, 2